# Altium schematic symbol library con-molex.SCHLIB: 368 symbols (part 5 of 6) (continued)
## C-GRID-02-15-19 (continued)
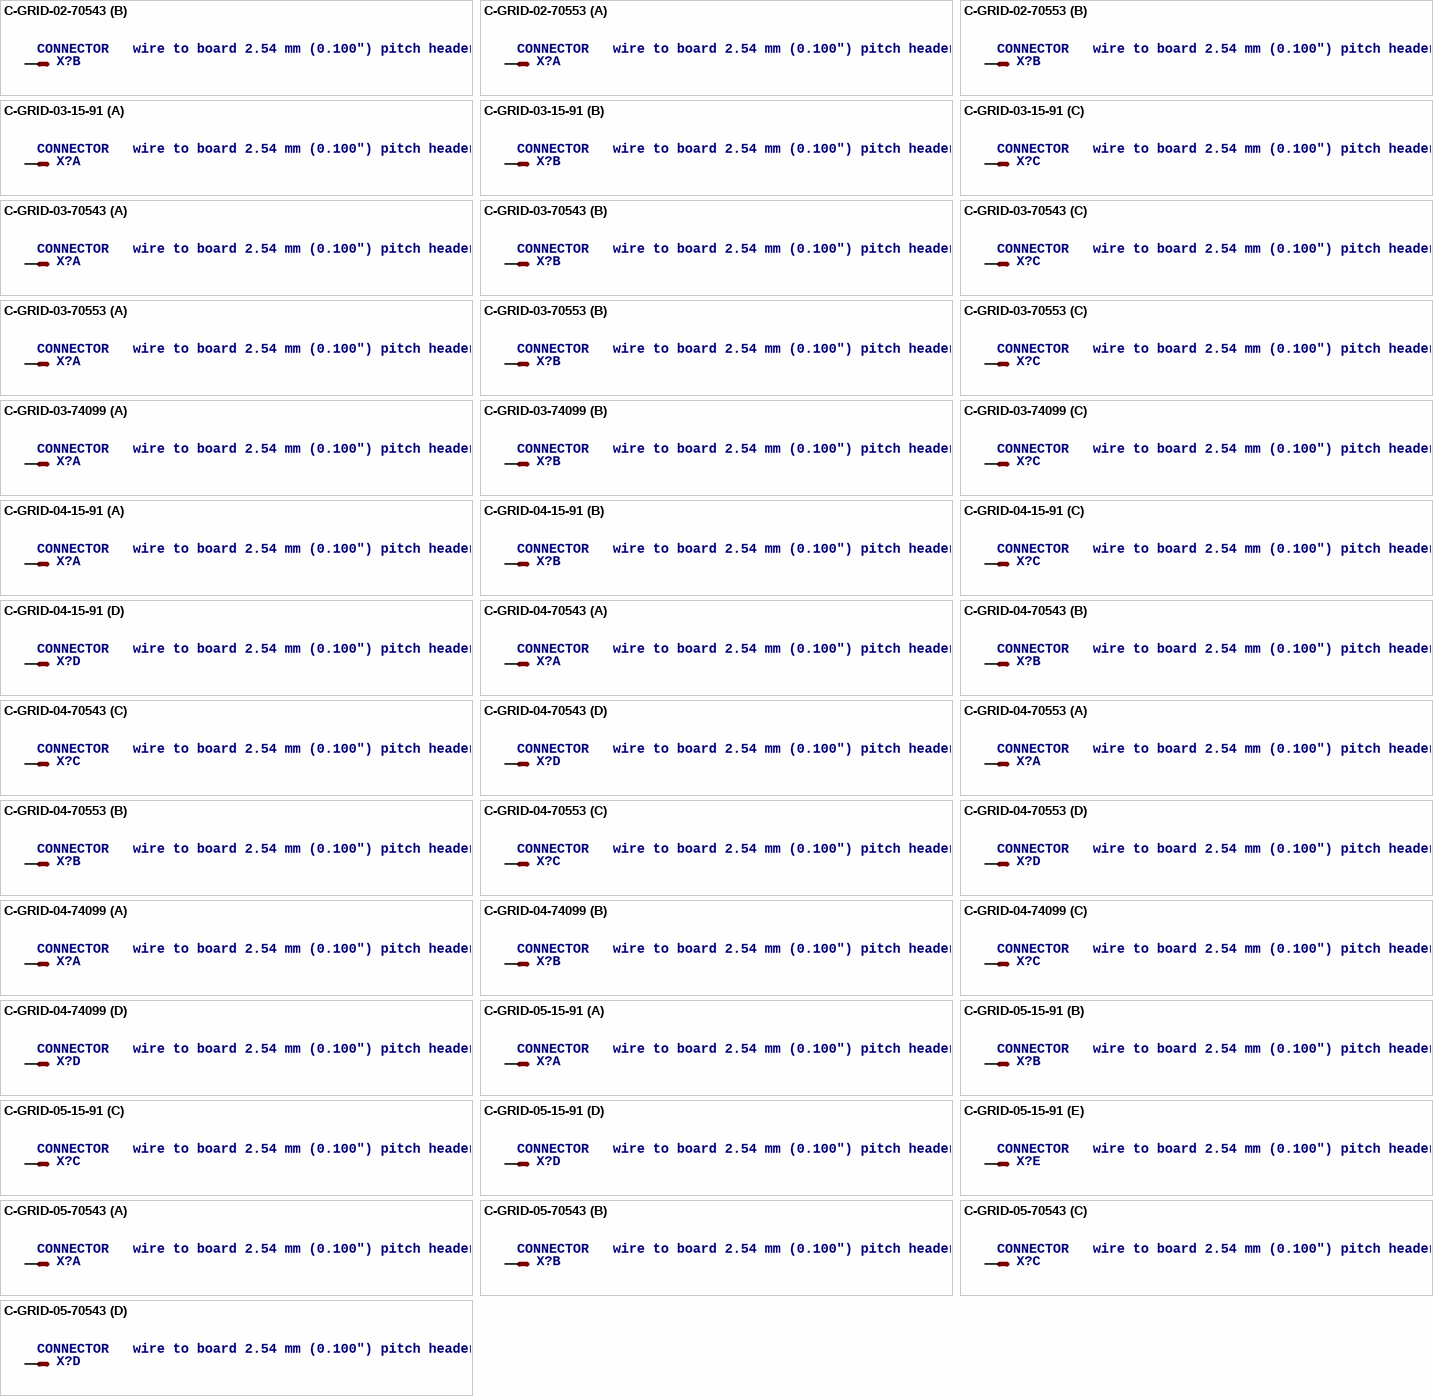
[diagram p106: symbols C-GRID-02-70543 to C-GRID-05-70543]

## C-GRID-02-70543
designator X?, comment CONNECTOR   wire to board 2.54 mm (0.100") pitch header
OC_FARNELL: unknown; OC_NEWARK: unknown
footprint 70543-02
part A pins: 2 S
part B pins: 1 S

## C-GRID-02-70553
designator X?, comment CONNECTOR   wire to board 2.54 mm (0.100") pitch header
OC_FARNELL: unknown; OC_NEWARK: unknown
footprint 70553-02
part A pins: 2 S
part B pins: 1 S

## C-GRID-03-15-91
designator X?, comment CONNECTOR   wire to board 2.54 mm (0.100") pitch header
OC_FARNELL: unknown; OC_NEWARK: unknown
footprint 15-91-03
part A pins: 1 S
part B pins: 2 S
part C pins: 3 S

## C-GRID-03-70543
designator X?, comment CONNECTOR   wire to board 2.54 mm (0.100") pitch header
OC_FARNELL: unknown; OC_NEWARK: unknown
footprint 70543-03
part A pins: 1 S
part B pins: 2 S
part C pins: 3 S

## C-GRID-03-70553
designator X?, comment CONNECTOR   wire to board 2.54 mm (0.100") pitch header
OC_FARNELL: unknown; OC_NEWARK: unknown
footprint 70553-03
part A pins: 1 S
part B pins: 2 S
part C pins: 3 S

## C-GRID-03-74099
designator X?, comment CONNECTOR   wire to board 2.54 mm (0.100") pitch header
OC_FARNELL: unknown; OC_NEWARK: unknown
footprint 74099-03
part A pins: 1 S
part B pins: 2 S
part C pins: 3 S

## C-GRID-04-15-91
designator X?, comment CONNECTOR   wire to board 2.54 mm (0.100") pitch header
OC_FARNELL: unknown; OC_NEWARK: unknown
footprint 15-91-04
part A pins: 1 S
part B pins: 2 S
part C pins: 3 S
part D pins: 4 S

## C-GRID-04-70543
designator X?, comment CONNECTOR   wire to board 2.54 mm (0.100") pitch header
OC_FARNELL: unknown; OC_NEWARK: unknown
footprint 70543-04
part A pins: 1 S
part B pins: 2 S
part C pins: 3 S
part D pins: 4 S

## C-GRID-04-70553
designator X?, comment CONNECTOR   wire to board 2.54 mm (0.100") pitch header
OC_FARNELL: unknown; OC_NEWARK: unknown
footprint 70553-04
part A pins: 1 S
part B pins: 2 S
part C pins: 3 S
part D pins: 4 S

## C-GRID-04-74099
designator X?, comment CONNECTOR   wire to board 2.54 mm (0.100") pitch header
OC_FARNELL: unknown; OC_NEWARK: unknown
footprint 74099-04
part A pins: 1 S
part B pins: 2 S
part C pins: 3 S
part D pins: 4 S

## C-GRID-05-15-91
designator X?, comment CONNECTOR   wire to board 2.54 mm (0.100") pitch header
OC_FARNELL: unknown; OC_NEWARK: unknown
footprint 15-91-05
part A pins: 1 S
part B pins: 2 S
part C pins: 3 S
part D pins: 4 S
part E pins: 5 S

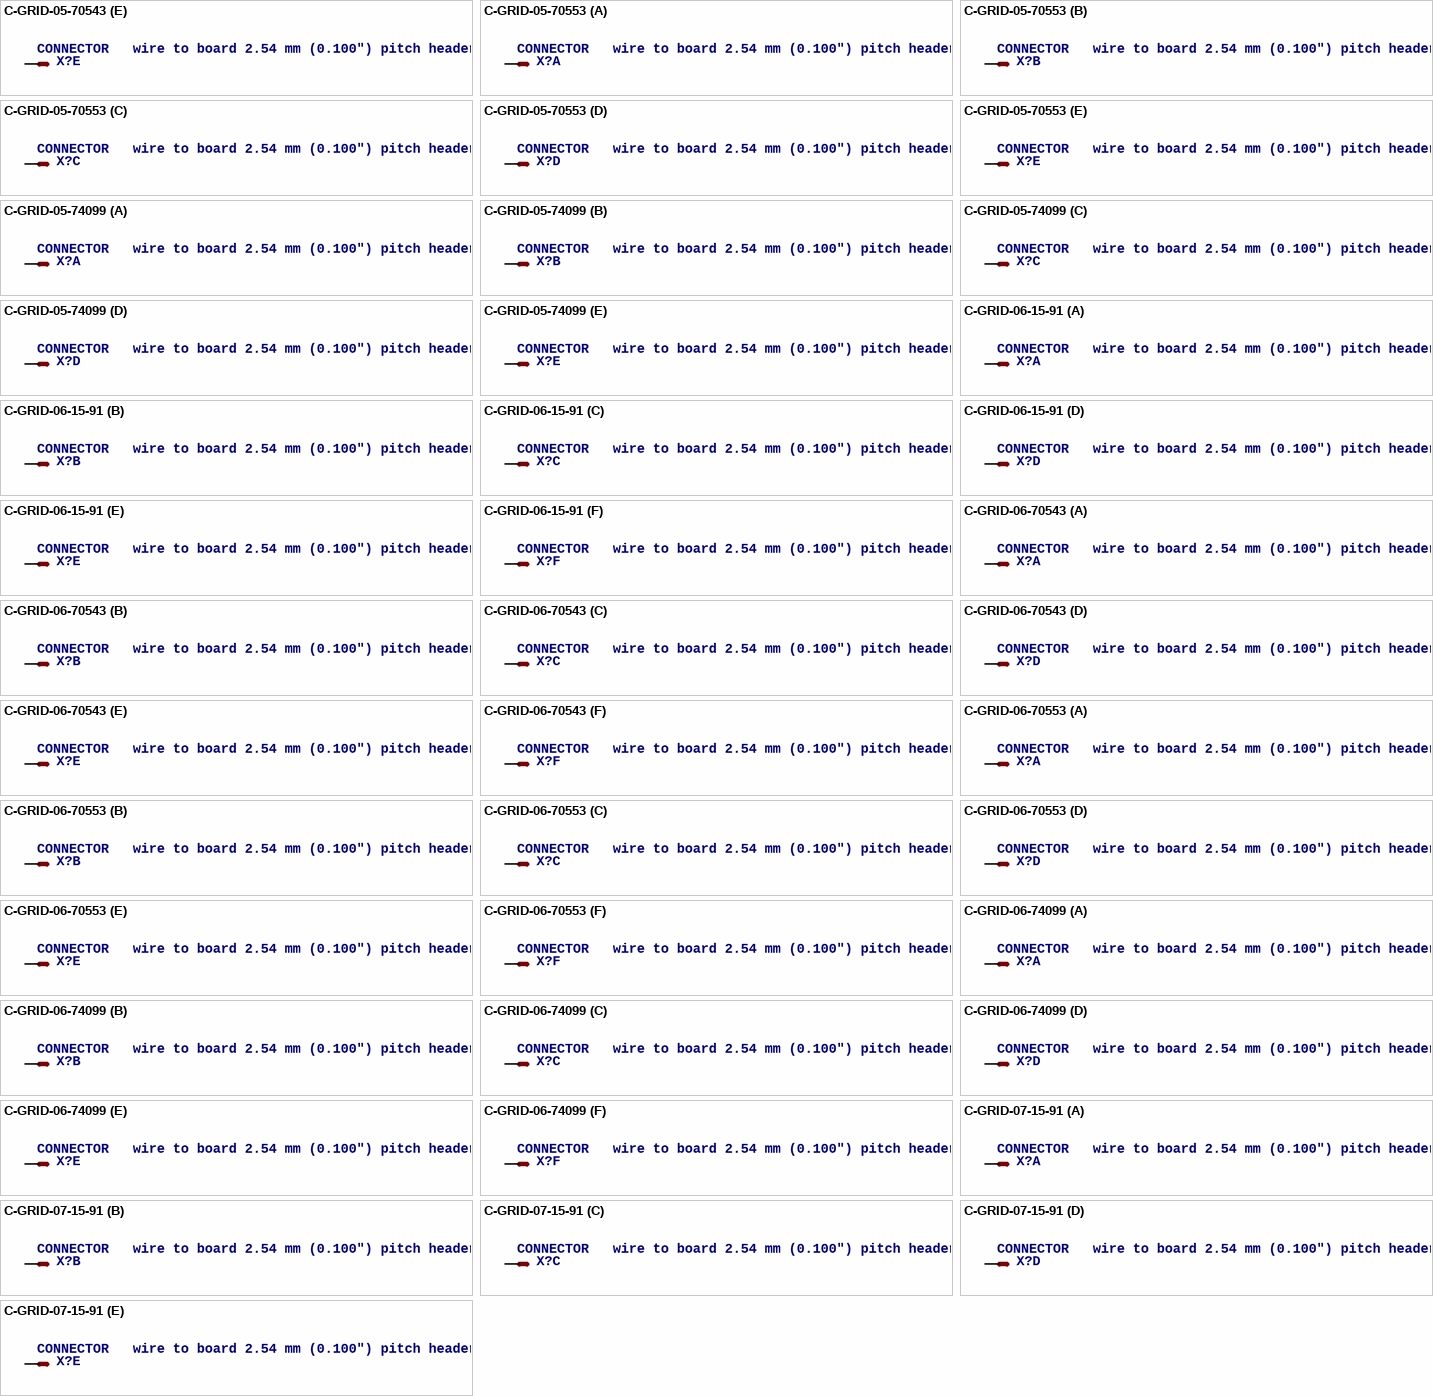
[diagram p107: symbols C-GRID-05-70543 to C-GRID-07-15-91]

## C-GRID-05-70543
designator X?, comment CONNECTOR   wire to board 2.54 mm (0.100") pitch header
OC_FARNELL: unknown; OC_NEWARK: unknown
footprint 70543-05
part A pins: 1 S
part B pins: 2 S
part C pins: 3 S
part D pins: 4 S
part E pins: 5 S

## C-GRID-05-70553
designator X?, comment CONNECTOR   wire to board 2.54 mm (0.100") pitch header
OC_FARNELL: unknown; OC_NEWARK: unknown
footprint 70553-05
part A pins: 1 S
part B pins: 2 S
part C pins: 3 S
part D pins: 4 S
part E pins: 5 S

## C-GRID-05-74099
designator X?, comment CONNECTOR   wire to board 2.54 mm (0.100") pitch header
OC_FARNELL: unknown; OC_NEWARK: unknown
footprint 74099-05
part A pins: 1 S
part B pins: 2 S
part C pins: 3 S
part D pins: 4 S
part E pins: 5 S

## C-GRID-06-15-91
designator X?, comment CONNECTOR   wire to board 2.54 mm (0.100") pitch header
OC_FARNELL: unknown; OC_NEWARK: unknown
footprint 15-91-06
part A pins: 1 S
part B pins: 2 S
part C pins: 3 S
part D pins: 4 S
part E pins: 5 S
part F pins: 6 S

## C-GRID-06-70543
designator X?, comment CONNECTOR   wire to board 2.54 mm (0.100") pitch header
OC_FARNELL: unknown; OC_NEWARK: unknown
footprint 70543-06
part A pins: 1 S
part B pins: 2 S
part C pins: 3 S
part D pins: 4 S
part E pins: 5 S
part F pins: 6 S

## C-GRID-06-70553
designator X?, comment CONNECTOR   wire to board 2.54 mm (0.100") pitch header
OC_FARNELL: unknown; OC_NEWARK: unknown
footprint 70553-06
part A pins: 1 S
part B pins: 2 S
part C pins: 3 S
part D pins: 4 S
part E pins: 5 S
part F pins: 6 S

## C-GRID-06-74099
designator X?, comment CONNECTOR   wire to board 2.54 mm (0.100") pitch header
OC_FARNELL: unknown; OC_NEWARK: unknown
footprint 74099-06
part A pins: 1 S
part B pins: 2 S
part C pins: 3 S
part D pins: 4 S
part E pins: 5 S
part F pins: 6 S

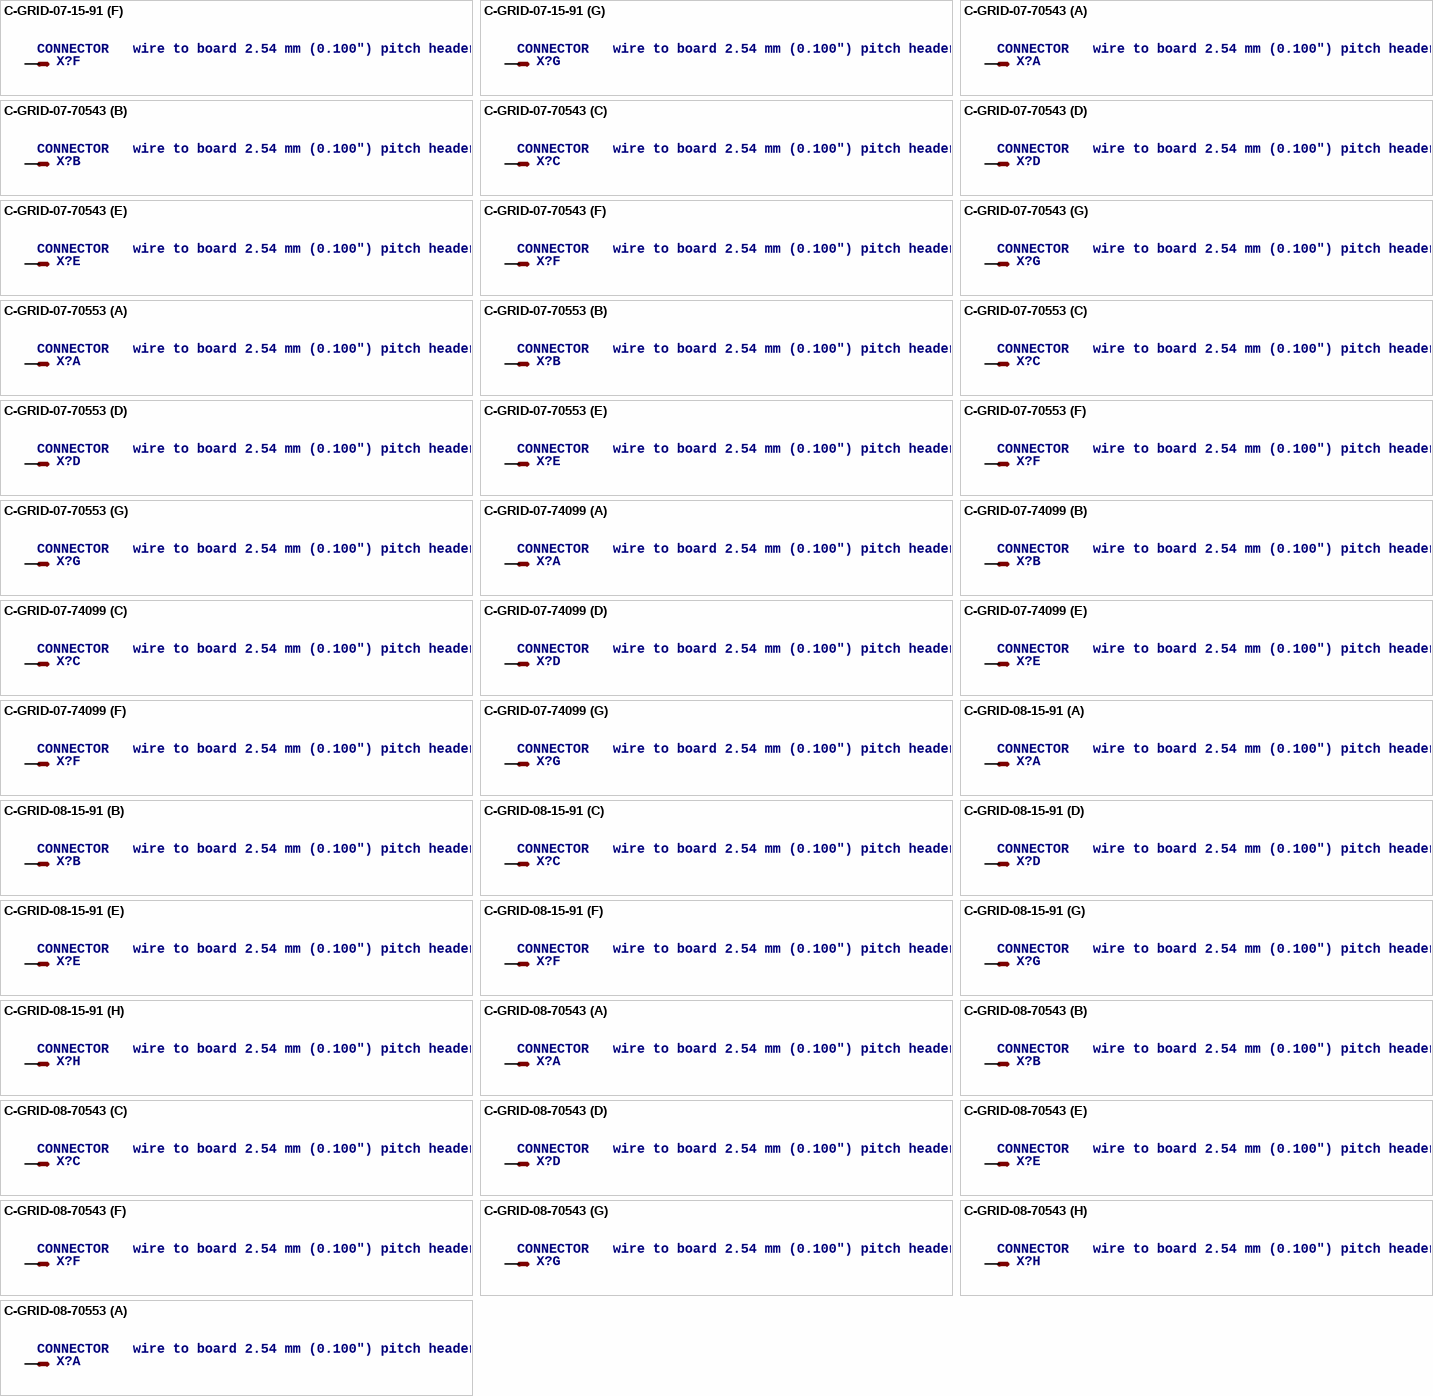
[diagram p108: symbols C-GRID-07-15-91 to C-GRID-08-70553]

## C-GRID-07-15-91
designator X?, comment CONNECTOR   wire to board 2.54 mm (0.100") pitch header
OC_FARNELL: unknown; OC_NEWARK: unknown
footprint 15-91-07
part A pins: 1 S
part B pins: 2 S
part C pins: 3 S
part D pins: 4 S
part E pins: 5 S
part F pins: 6 S
part G pins: 7 S

## C-GRID-07-70543
designator X?, comment CONNECTOR   wire to board 2.54 mm (0.100") pitch header
OC_FARNELL: unknown; OC_NEWARK: unknown
footprint 70543-07
part A pins: 1 S
part B pins: 2 S
part C pins: 3 S
part D pins: 4 S
part E pins: 5 S
part F pins: 6 S
part G pins: 7 S

## C-GRID-07-70553
designator X?, comment CONNECTOR   wire to board 2.54 mm (0.100") pitch header
OC_FARNELL: unknown; OC_NEWARK: unknown
footprint 70553-07
part A pins: 1 S
part B pins: 2 S
part C pins: 3 S
part D pins: 4 S
part E pins: 5 S
part F pins: 6 S
part G pins: 7 S

## C-GRID-07-74099
designator X?, comment CONNECTOR   wire to board 2.54 mm (0.100") pitch header
OC_FARNELL: unknown; OC_NEWARK: unknown
footprint 74099-07
part A pins: 1 S
part B pins: 2 S
part C pins: 3 S
part D pins: 4 S
part E pins: 5 S
part F pins: 6 S
part G pins: 7 S

## C-GRID-08-15-91
designator X?, comment CONNECTOR   wire to board 2.54 mm (0.100") pitch header
OC_FARNELL: unknown; OC_NEWARK: unknown
footprint 15-91-08
part A pins: 1 S
part B pins: 2 S
part C pins: 3 S
part D pins: 4 S
part E pins: 5 S
part F pins: 6 S
part G pins: 7 S
part H pins: 8 S

## C-GRID-08-70543
designator X?, comment CONNECTOR   wire to board 2.54 mm (0.100") pitch header
OC_FARNELL: unknown; OC_NEWARK: unknown
footprint 70543-08
part A pins: 1 S
part B pins: 2 S
part C pins: 3 S
part D pins: 4 S
part E pins: 5 S
part F pins: 6 S
part G pins: 7 S
part H pins: 8 S

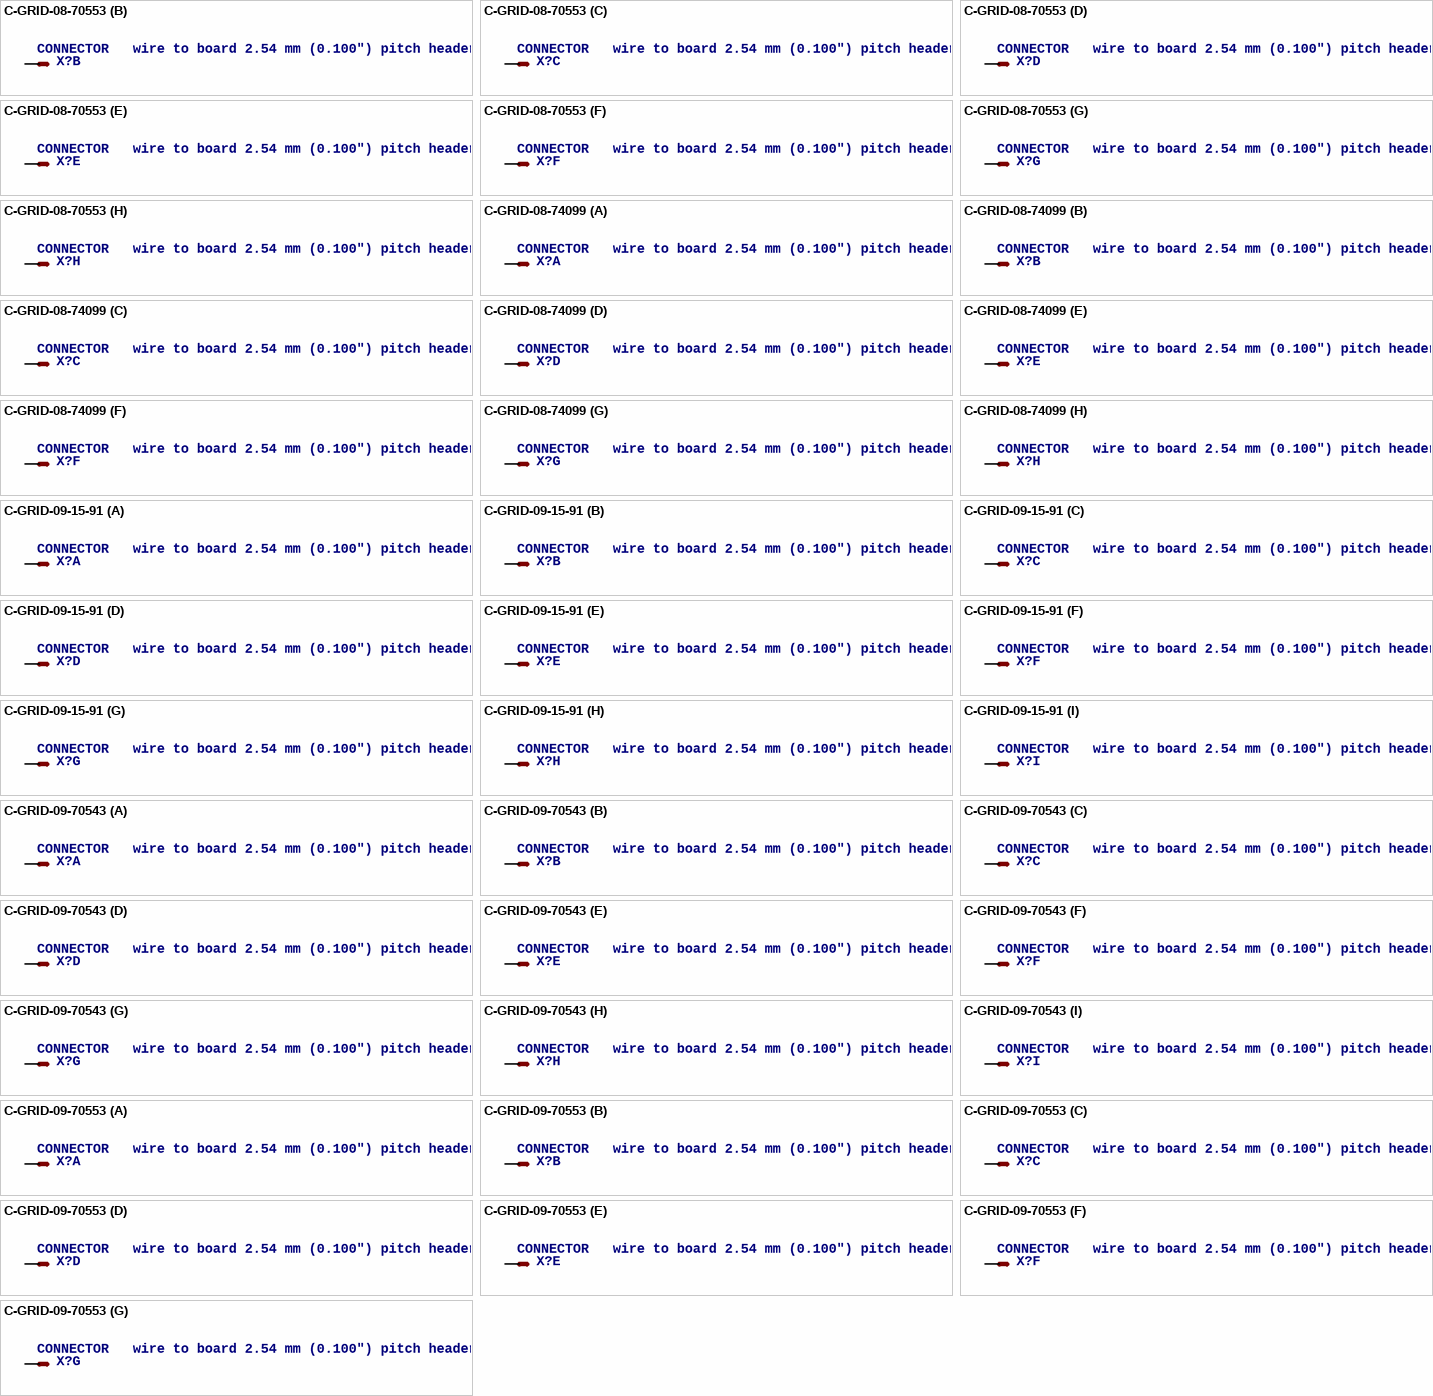
[diagram p109: symbols C-GRID-08-70553 to C-GRID-09-70553]

## C-GRID-08-70553
designator X?, comment CONNECTOR   wire to board 2.54 mm (0.100") pitch header
OC_FARNELL: unknown; OC_NEWARK: unknown
footprint 70553-08
part A pins: 1 S
part B pins: 2 S
part C pins: 3 S
part D pins: 4 S
part E pins: 5 S
part F pins: 6 S
part G pins: 7 S
part H pins: 8 S

## C-GRID-08-74099
designator X?, comment CONNECTOR   wire to board 2.54 mm (0.100") pitch header
OC_FARNELL: unknown; OC_NEWARK: unknown
footprint 74099-08
part A pins: 1 S
part B pins: 2 S
part C pins: 3 S
part D pins: 4 S
part E pins: 5 S
part F pins: 6 S
part G pins: 7 S
part H pins: 8 S

## C-GRID-09-15-91
designator X?, comment CONNECTOR   wire to board 2.54 mm (0.100") pitch header
OC_FARNELL: unknown; OC_NEWARK: unknown
footprint 15-91-09
part A pins: 1 S
part B pins: 2 S
part C pins: 3 S
part D pins: 4 S
part E pins: 5 S
part F pins: 6 S
part G pins: 7 S
part H pins: 8 S
part I pins: 9 S

## C-GRID-09-70543
designator X?, comment CONNECTOR   wire to board 2.54 mm (0.100") pitch header
OC_FARNELL: unknown; OC_NEWARK: unknown
footprint 70543-09
part A pins: 1 S
part B pins: 2 S
part C pins: 3 S
part D pins: 4 S
part E pins: 5 S
part F pins: 6 S
part G pins: 7 S
part H pins: 8 S
part I pins: 9 S
